# Altium footprint library Connectors THD.PcbLib: 631 footprints (part 10 of 46)
Each footprint in its own frame and in the unit in brackets; x right, y up, seen from the top. Pads: shape width x height; smd on the part's side, far side on the other; paste and mask are expansions set on the pad; w line width, h text height; cw(c..) or ccw(c..) is an arc to the next point about the centre after c.
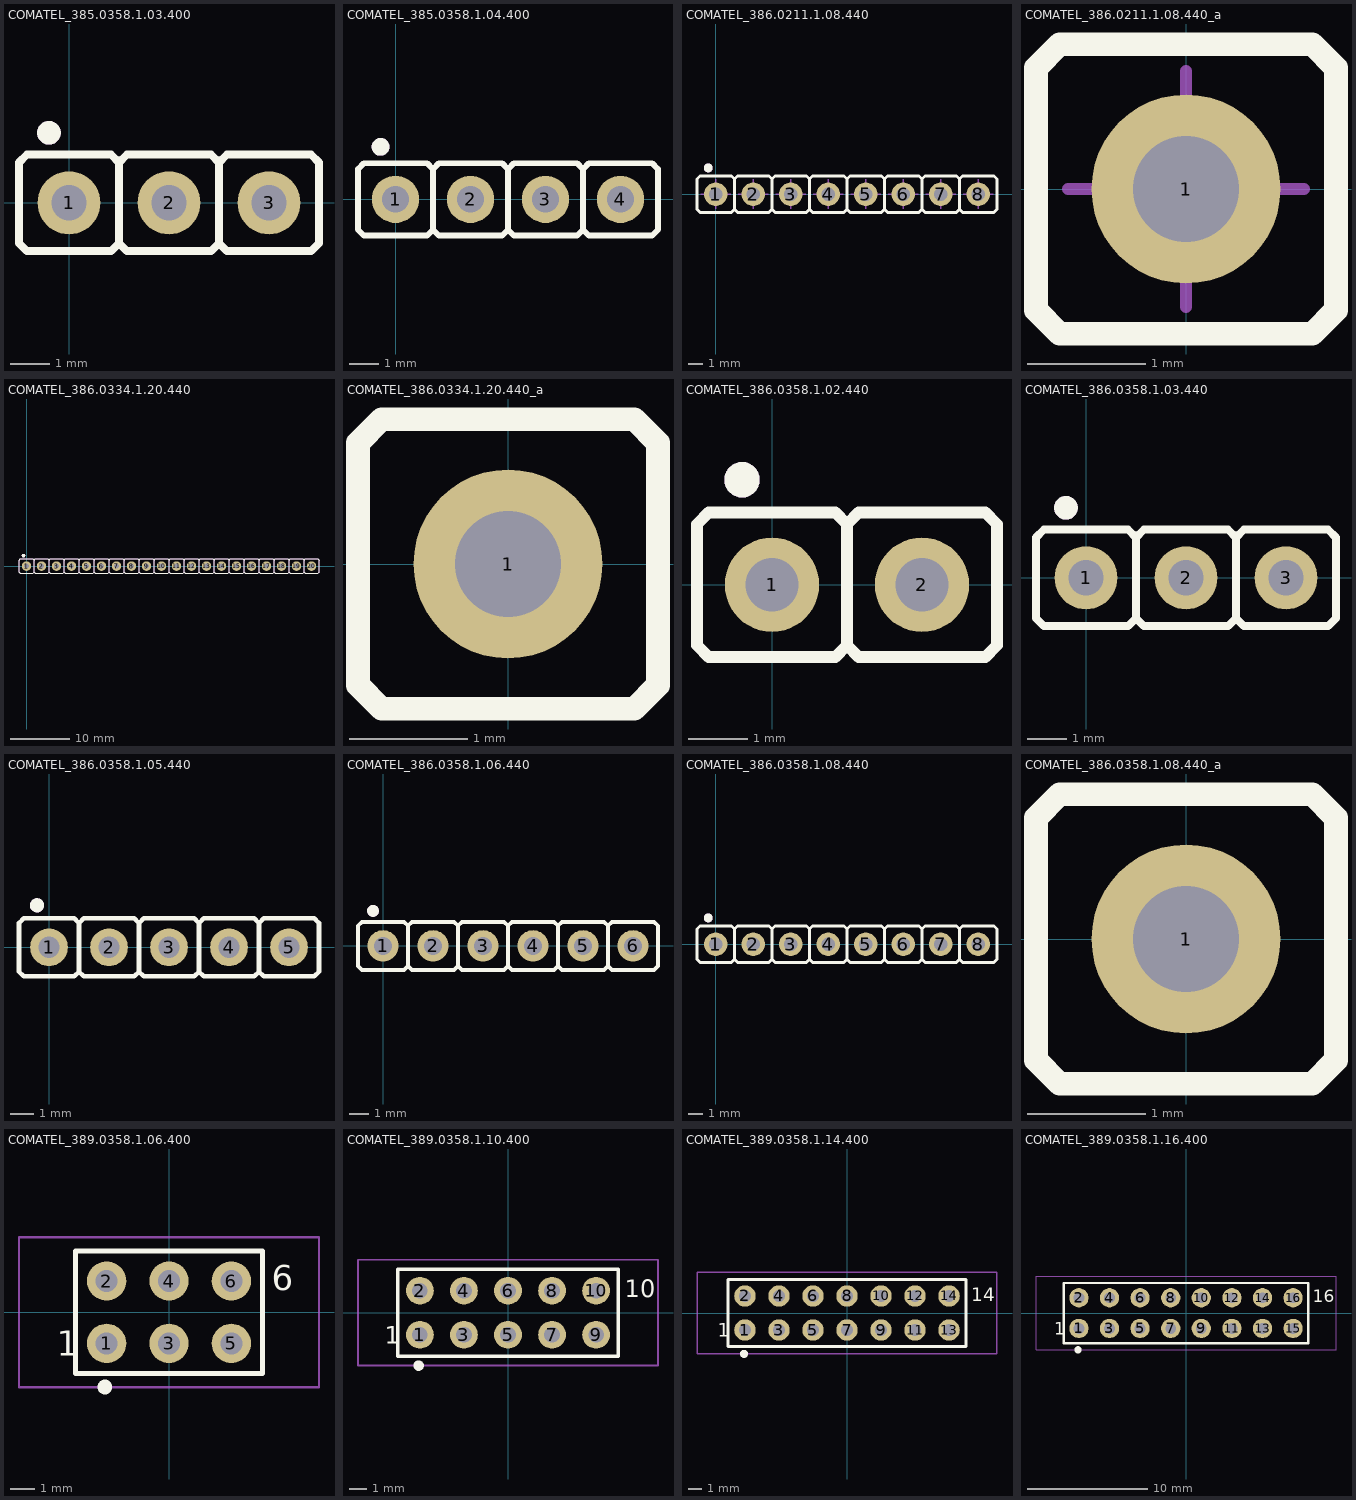
[diagram p9: the footprints below, top view; thin cyan lines are the x and y axes]

## COMATEL_385.0358.1.03.400 [mm] "3 Contacts Straight Strip Header Pitch 2.54mm L=6.3mm ''Mini-Wire-Wrap''"
height 8
pads (3):
  round 1.6 hole 0.9: 1(0,0) 2(2.54,0) 3(5.08,0)
Top Overlay:
  circle w0.3: c-0.508,1.778 r0.15
  lines w0.2: -1.27,1.025 -1.07,1.225 ; -1.27,1.025 -1.27,-1.025 -1.07,-1.225 1.07,-1.225 1.27,-1.025 ; -1.27,1.025 -1.07,1.225 ; -1.07,1.225 1.07,1.225 1.27,1.025 ; 1.27,-1.025 1.27,1.025 ; 1.27,-1.025 1.47,-1.225 3.61,-1.225 3.81,-1.025 ; 1.27,1.025 1.47,1.225 3.61,1.225 3.81,1.025 ; 3.81,-1.025 3.81,1.025 ; 3.81,-1.025 4.01,-1.225 6.15,-1.225 6.35,-1.025 6.35,1.025 6.15,1.225 4.01,1.225 3.81,1.025
Mechanical 14:
  circle w0.3: c-0.508,1.778 r0.15
  lines w0.1: 1.27,-1.025 1.07,-1.225 -1.07,-1.225 -1.27,-1.025 -1.27,1.025 -1.07,1.225 1.07,1.225 1.27,1.025 ; 1.27,-1.025 1.27,1.025 ; 1.27,-1.025 1.47,-1.225 3.61,-1.225 3.81,-1.025 ; 1.27,1.025 1.47,1.225 3.61,1.225 3.81,1.025 ; 3.81,-1.025 3.81,1.025 ; 3.81,-1.025 4.01,-1.225 6.15,-1.225 6.35,-1.025 6.35,1.025 6.15,1.225 4.01,1.225 3.81,1.025
3D body: height 8, standoff -3.2, extent -1.27,-1.225 6.35,1.225

## COMATEL_385.0358.1.04.400 [mm] "4 Contacts Straight Strip Header Pitch 2.54mm L=6.3mm ''Mini-Wire-Wrap''"
height 8
pads (4):
  round 1.6 hole 0.9: 1(0,0) 2(2.54,0) 3(5.08,0) 4(7.62,0)
Top Overlay:
  circle w0.3: c-0.508,1.778 r0.15
  lines w0.2: 1.27,-1.025 1.07,-1.225 -1.07,-1.225 -1.27,-1.025 -1.27,1.025 -1.07,1.225 1.07,1.225 1.27,1.025 ; 1.27,-1.025 1.27,1.025 ; 1.27,-1.025 1.47,-1.225 3.61,-1.225 3.81,-1.025 ; 1.27,1.025 1.47,1.225 3.61,1.225 3.81,1.025 ; 3.81,-1.025 3.81,1.025 ; 3.81,-1.025 4.01,-1.225 6.15,-1.225 6.35,-1.025 ; 3.81,1.025 4.01,1.225 6.15,1.225 6.35,1.025 ; 6.35,-1.025 6.55,-1.225 8.69,-1.225 8.89,-1.025 8.89,1.025 8.69,1.225 6.55,1.225 6.35,1.025 ; 6.35,-1.025 6.35,1.025
Mechanical 14:
  circle w0.3: c-0.508,1.778 r0.15
  lines w0.1: 1.27,-1.025 1.07,-1.225 -1.07,-1.225 -1.27,-1.025 -1.27,1.025 -1.07,1.225 1.07,1.225 1.27,1.025 ; 1.27,-1.025 1.27,1.025 ; 1.27,-1.025 1.47,-1.225 3.61,-1.225 3.81,-1.025 ; 1.27,1.025 1.47,1.225 3.61,1.225 3.81,1.025 ; 3.81,-1.025 3.81,1.025 ; 3.81,-1.025 4.01,-1.225 6.15,-1.225 6.35,-1.025 ; 3.81,1.025 4.01,1.225 6.15,1.225 6.35,1.025 ; 6.35,-1.025 6.55,-1.225 8.69,-1.225 8.89,-1.025 8.89,1.025 8.69,1.225 6.55,1.225 6.35,1.025 ; 6.35,-1.025 6.35,1.025 ; 6.35,-1.025 6.35,1.025
3D body: height 8, standoff -3.2, extent -1.27,-1.225 8.89,1.225

## COMATEL_386.0211.1.08.440 [mm] "Wire-Wrap contact (Pin Length= 16.5mm)"
height 18.2
pads (8):
  round 1.6 hole 0.9: 1(0,0) 2(2.54,0) 3(5.08,0) 4(7.62,0) 5(10.16,0) 6(12.7,0) 7(15.24,0) 8(17.78,0)
Top Overlay:
  circle w0.3: c-0.508,1.778 r0.15
  lines w0.2: 1.27,-1.025 1.27,1.025 ; 1.27,-1.025 1.47,-1.225 3.61,-1.225 3.81,-1.025 ; 1.27,-1.025 1.27,1.025 ; 1.27,-1.025 1.07,-1.225 -1.07,-1.225 -1.27,-1.025 -1.27,1.025 -1.07,1.225 1.07,1.225 1.27,1.025 ; 1.27,1.025 1.47,1.225 3.61,1.225 3.81,1.025 ; 3.81,-1.025 3.81,1.025 ; 3.81,-1.025 4.01,-1.225 6.15,-1.225 6.35,-1.025 ; 3.81,-1.025 3.81,1.025 ; 3.81,1.025 4.01,1.225 6.15,1.225 6.35,1.025 ; 6.35,-1.025 6.35,1.025 ; 6.35,-1.025 6.55,-1.225 8.69,-1.225 8.89,-1.025 ; 6.35,-1.025 6.35,1.025 ; 6.35,1.025 6.55,1.225 8.69,1.225 8.89,1.025 ; 8.89,-1.025 8.89,1.025 ; 8.89,-1.025 9.09,-1.225 11.23,-1.225 11.43,-1.025 ; 8.89,-1.025 8.89,1.025 ; 8.89,1.025 9.09,1.225 11.23,1.225 11.43,1.025 ; 11.43,-1.025 11.43,1.025 ; 11.43,-1.025 11.63,-1.225 13.77,-1.225 13.97,-1.025 ; 11.43,-1.025 11.43,1.025 ; 11.43,1.025 11.63,1.225 13.77,1.225 13.97,1.025 ; 13.97,-1.025 13.97,1.025 ; 13.97,-1.025 14.17,-1.225 16.31,-1.225 16.51,-1.025 ; 13.97,-1.025 13.97,1.025 ; 13.97,1.025 14.17,1.225 16.31,1.225 16.51,1.025 ; 16.51,-1.025 16.51,1.025 ; 16.51,-1.025 16.71,-1.225 18.85,-1.225 19.05,-1.025 19.05,1.025 18.85,1.225 16.71,1.225 16.51,1.025 ; 16.51,-1.025 16.51,1.025
Mechanical 8:
  lines w0.1: -1,0 0,0 ; 0,-1 0,0 ; 0,1 0,0 ; 1,0 0,0 ; 1.54,0 2.54,0 ; 2.54,-1 2.54,0 ; 2.54,1 2.54,0 ; 3.54,0 2.54,0 ; 4.08,0 5.08,0 ; 5.08,-1 5.08,0 ; 5.08,1 5.08,0 ; 6.08,0 5.08,0 ; 6.62,0 7.62,0 ; 7.62,-1 7.62,0 ; 7.62,1 7.62,0 ; 8.62,0 7.62,0 ; 9.16,0 10.16,0 ; 10.16,-1 10.16,0 ; 10.16,1 10.16,0 ; 11.16,0 10.16,0 ; 11.7,0 12.7,0 ; 12.7,-1 12.7,0 ; 12.7,1 12.7,0 ; 13.7,0 12.7,0 ; 14.24,0 15.24,0 ; 15.24,-1 15.24,0 ; 15.24,1 15.24,0 ; 16.24,0 15.24,0 ; 16.78,0 17.78,0 ; 17.78,-1 17.78,0 ; 17.78,1 17.78,0 ; 18.78,0 17.78,0
Mechanical 14:
  circle w0.3: c-0.508,1.778 r0.15
  lines w0.1: 1.27,-1.025 1.47,-1.225 3.61,-1.225 3.81,-1.025 ; 1.27,-1.025 1.27,1.025 ; 1.27,-1.025 1.07,-1.225 -1.07,-1.225 -1.27,-1.025 -1.27,1.025 -1.07,1.225 1.07,1.225 1.27,1.025 ; 1.27,-1.025 1.27,1.025 ; 1.27,1.025 1.47,1.225 3.61,1.225 3.81,1.025 ; 3.81,-1.025 4.01,-1.225 6.15,-1.225 6.35,-1.025 ; 3.81,-1.025 3.81,1.025 ; 3.81,-1.025 3.81,1.025 ; 3.81,1.025 4.01,1.225 6.15,1.225 6.35,1.025 ; 6.35,-1.025 6.55,-1.225 8.69,-1.225 8.89,-1.025 ; 6.35,-1.025 6.35,1.025 ; 6.35,-1.025 6.35,1.025 ; 6.35,1.025 6.55,1.225 8.69,1.225 8.89,1.025 ; 8.89,-1.025 9.09,-1.225 11.23,-1.225 11.43,-1.025 ; 8.89,-1.025 8.89,1.025 ; 8.89,-1.025 8.89,1.025 ; 8.89,1.025 9.09,1.225 11.23,1.225 11.43,1.025 ; 11.43,-1.025 11.63,-1.225 13.77,-1.225 13.97,-1.025 ; 11.43,-1.025 11.43,1.025 ; 11.43,-1.025 11.43,1.025 ; 11.43,1.025 11.63,1.225 13.77,1.225 13.97,1.025 ; 13.97,-1.025 14.17,-1.225 16.31,-1.225 16.51,-1.025 ; 13.97,-1.025 13.97,1.025 ; 13.97,-1.025 13.97,1.025 ; 13.97,1.025 14.17,1.225 16.31,1.225 16.51,1.025 ; 16.51,-1.025 16.71,-1.225 18.85,-1.225 19.05,-1.025 19.05,1.025 18.85,1.225 16.71,1.225 16.51,1.025 ; 16.51,-1.025 16.51,1.025 ; 16.51,-1.025 16.51,1.025
3D body: height 18.2, standoff -3.8, extent -1.27,-1.225 19.05,1.225

## COMATEL_386.0211.1.08.440_a [mm] "Wire-Wrap contact (Pin Length= 16.5mm)"
height 18.2
pads (1):
  round 1.6 hole 0.9: 1(0,0)
Top Overlay:
  lines w0.2: -1.27,-1.025 -1.07,-1.225 1.07,-1.225 1.27,-1.025 1.27,1.025 1.07,1.225 -1.07,1.225 -1.27,1.025 -1.27,-1.025
Mechanical 8:
  lines w0.1: -1,0 0,0 ; 0,-1 0,0 ; 0,1 0,0 ; 1,0 0,0
Mechanical 14:
  lines w0.1: -1.27,-1.025 -1.27,1.025 -1.07,1.225 1.07,1.225 1.27,1.025 1.27,-1.025 1.07,-1.225 -1.07,-1.225 -1.27,-1.025
3D body: height 18.2, standoff -3.8, extent -1.27,-1.225 1.27,1.225

## COMATEL_386.0334.1.20.440 [mm] "Wire-Wrap contact (Pin Length= 7.5mm)"
height 9.2
pads (20):
  round 1.6 hole 0.9: 1(0,0) 2(2.54,0) 3(5.08,0) 4(7.62,0) 5(10.16,0) 6(12.7,0) 7(15.24,0) 8(17.78,0) 9(20.32,0) 10(22.86,0) 11(25.4,0) 12(27.94,0) 13(30.48,0) 14(33.02,0) 15(35.56,0) 16(38.1,0) 17(40.64,0) 18(43.18,0) 19(45.72,0) 20(48.26,0)
Top Overlay:
  drawing of 161 lines, arcs and shapes, not listed
Mechanical 14:
  drawing of 161 lines, arcs and shapes, not listed
3D body: height 9.2, standoff -3.3, extent -1.27,-1.225 49.53,1.225

## COMATEL_386.0334.1.20.440_a [mm] "Wire-Wrap contact (Pin Length= 7.5mm)"
height 9.2
pads (1):
  round 1.6 hole 0.9: 1(0,0)
Top Overlay:
  lines w0.2: -1.27,-1.025 -1.07,-1.225 1.07,-1.225 1.27,-1.025 1.27,1.025 1.07,1.225 -1.07,1.225 -1.27,1.025 -1.27,-1.025
Mechanical 14:
  lines w0.1: -1.27,-1.025 -1.27,1.025 -1.07,1.225 1.07,1.225 1.27,1.025 1.27,-1.025 1.07,-1.225 -1.07,-1.225 -1.27,-1.025
3D body: height 9.2, standoff -3.3, extent -1.27,-1.225 1.27,1.225

## COMATEL_386.0358.1.02.440 [mm] "2 Contacts Straight Strip Header Pitch 2.54mm L=6.3mm ''Mini-Wire-Wrap''"
height 8
pads (2):
  round 1.6 hole 0.9: 1(0,0) 2(2.54,0)
Top Overlay:
  circle w0.3: c-0.508,1.778 r0.15
  lines w0.2: 1.27,-1.025 1.07,-1.225 -1.07,-1.225 -1.27,-1.025 -1.27,1.025 -1.07,1.225 1.07,1.225 1.27,1.025 ; 1.27,-1.025 1.27,1.025 ; 1.27,-1.025 1.47,-1.225 3.61,-1.225 3.81,-1.025 3.81,1.025 3.61,1.225 1.47,1.225 1.27,1.025
Mechanical 14:
  circle w0.3: c-0.508,1.778 r0.15
  lines w0.1: 1.27,-1.025 1.07,-1.225 -1.07,-1.225 -1.27,-1.025 -1.27,1.025 -1.07,1.225 1.07,1.225 1.27,1.025 ; 1.27,-1.025 1.27,1.025 ; 1.27,-1.025 1.47,-1.225 3.61,-1.225 3.81,-1.025 3.81,1.025 3.61,1.225 1.47,1.225 1.27,1.025
3D body: height 8, standoff -3.2, extent -1.27,-1.225 3.81,1.225

## COMATEL_386.0358.1.03.440 [mm] "3 Contacts Straight Strip Header Pitch 2.54mm L=6.3mm ''Mini-Wire-Wrap''"
height 8
pads (3):
  round 1.6 hole 0.9: 1(0,0) 2(2.54,0) 3(5.08,0)
Top Overlay:
  circle w0.3: c-0.508,1.778 r0.15
  lines w0.2: 1.27,-1.025 1.07,-1.225 -1.07,-1.225 -1.27,-1.025 -1.27,1.025 -1.07,1.225 1.07,1.225 1.27,1.025 ; 1.27,-1.025 1.27,1.025 ; 1.27,-1.025 1.47,-1.225 3.61,-1.225 3.81,-1.025 ; 1.27,1.025 1.47,1.225 3.61,1.225 3.81,1.025 ; 3.81,-1.025 3.81,1.025 ; 3.81,-1.025 4.01,-1.225 6.15,-1.225 6.35,-1.025 6.35,1.025 6.15,1.225 4.01,1.225 3.81,1.025
Mechanical 14:
  circle w0.3: c-0.508,1.778 r0.15
  lines w0.1: 1.27,-1.025 1.07,-1.225 -1.07,-1.225 -1.27,-1.025 -1.27,1.025 -1.07,1.225 1.07,1.225 1.27,1.025 ; 1.27,-1.025 1.27,1.025 ; 1.27,-1.025 1.47,-1.225 3.61,-1.225 3.81,-1.025 ; 1.27,1.025 1.47,1.225 3.61,1.225 3.81,1.025 ; 3.81,-1.025 3.81,1.025 ; 3.81,-1.025 4.01,-1.225 6.15,-1.225 6.35,-1.025 6.35,1.025 6.15,1.225 4.01,1.225 3.81,1.025
3D body: height 8, standoff -3.2, extent -1.27,-1.225 6.35,1.225

## COMATEL_386.0358.1.05.440 [mm] "5 Contacts Straight Strip Header Pitch 2.54mm L=6.3mm ''Mini-Wire-Wrap''"
height 8
pads (5):
  round 1.6 hole 0.9: 1(0,0) 2(2.54,0) 3(5.08,0) 4(7.62,0) 5(10.16,0)
Top Overlay:
  circle w0.3: c-0.508,1.778 r0.15
  lines w0.2: 1.27,-1.025 1.07,-1.225 -1.07,-1.225 -1.27,-1.025 -1.27,1.025 -1.07,1.225 1.07,1.225 1.27,1.025 ; 1.27,-1.025 1.27,1.025 ; 1.27,-1.025 1.47,-1.225 3.61,-1.225 3.81,-1.025 ; 1.27,1.025 1.47,1.225 3.61,1.225 3.81,1.025 ; 3.81,-1.025 3.81,1.025 ; 3.81,-1.025 4.01,-1.225 6.15,-1.225 6.35,-1.025 ; 3.81,1.025 4.01,1.225 6.15,1.225 6.35,1.025 ; 6.35,-1.025 6.35,1.025 ; 6.35,-1.025 6.55,-1.225 8.69,-1.225 8.89,-1.025 ; 6.35,1.025 6.55,1.225 8.69,1.225 8.89,1.025 ; 8.89,-1.025 9.09,-1.225 11.23,-1.225 11.43,-1.025 11.43,1.025 11.23,1.225 9.09,1.225 8.89,1.025 ; 8.89,-1.025 8.89,1.025
Mechanical 14:
  circle w0.3: c-0.508,1.778 r0.15
  lines w0.1: 1.27,-1.025 1.07,-1.225 -1.07,-1.225 -1.27,-1.025 -1.27,1.025 -1.07,1.225 1.07,1.225 1.27,1.025 ; 1.27,-1.025 1.27,1.025 ; 1.27,-1.025 1.47,-1.225 3.61,-1.225 3.81,-1.025 ; 1.27,1.025 1.47,1.225 3.61,1.225 3.81,1.025 ; 3.81,-1.025 3.81,1.025 ; 3.81,-1.025 4.01,-1.225 6.15,-1.225 6.35,-1.025 ; 3.81,1.025 4.01,1.225 6.15,1.225 6.35,1.025 ; 6.35,-1.025 6.55,-1.225 8.69,-1.225 8.89,-1.025 ; 6.35,-1.025 6.35,1.025 ; 6.35,1.025 6.55,1.225 8.69,1.225 8.89,1.025 ; 8.89,-1.025 9.09,-1.225 11.23,-1.225 11.43,-1.025 11.43,1.025 11.23,1.225 9.09,1.225 8.89,1.025 ; 8.89,-1.025 8.89,1.025
3D body: height 8, standoff -3.2, extent -1.27,-1.225 11.43,1.225

## COMATEL_386.0358.1.06.440 [mm] "6 Contacts Straight Strip Header Pitch 2.54mm L=6.3mm ''Mini-Wire-Wrap''"
height 8
pads (6):
  round 1.6 hole 0.9: 1(0,0) 2(2.54,0) 3(5.08,0) 4(7.62,0) 5(10.16,0) 6(12.7,0)
Top Overlay:
  circle w0.3: c-0.508,1.778 r0.15
  lines w0.2: 1.27,-1.025 1.07,-1.225 -1.07,-1.225 -1.27,-1.025 -1.27,1.025 -1.07,1.225 1.07,1.225 1.27,1.025 ; 1.27,-1.025 1.27,1.025 ; 1.27,-1.025 1.47,-1.225 3.61,-1.225 3.81,-1.025 ; 1.27,1.025 1.47,1.225 3.61,1.225 3.81,1.025 ; 3.81,-1.025 3.81,1.025 ; 3.81,-1.025 4.01,-1.225 6.15,-1.225 6.35,-1.025 ; 3.81,1.025 4.01,1.225 6.15,1.225 6.35,1.025 ; 6.35,-1.025 6.35,1.025 ; 6.35,-1.025 6.55,-1.225 8.69,-1.225 8.89,-1.025 ; 6.35,1.025 6.55,1.225 8.69,1.225 8.89,1.025 ; 8.89,-1.025 9.09,-1.225 11.23,-1.225 11.43,-1.025 ; 8.89,-1.025 8.89,1.025 ; 8.89,1.025 9.09,1.225 11.23,1.225 11.43,1.025 ; 11.43,-1.025 11.63,-1.225 13.77,-1.225 13.97,-1.025 13.97,1.025 13.77,1.225 11.63,1.225 11.43,1.025 ; 11.43,-1.025 11.43,1.025
Mechanical 14:
  circle w0.3: c-0.508,1.778 r0.15
  lines w0.1: 1.27,-1.025 1.07,-1.225 -1.07,-1.225 -1.27,-1.025 -1.27,1.025 -1.07,1.225 1.07,1.225 1.27,1.025 ; 1.27,-1.025 1.27,1.025 ; 1.27,-1.025 1.47,-1.225 3.61,-1.225 3.81,-1.025 ; 1.27,1.025 1.47,1.225 3.61,1.225 3.81,1.025 ; 3.81,-1.025 3.81,1.025 ; 3.81,-1.025 4.01,-1.225 6.15,-1.225 6.35,-1.025 ; 3.81,1.025 4.01,1.225 6.15,1.225 6.35,1.025 ; 6.35,-1.025 6.55,-1.225 8.69,-1.225 8.89,-1.025 ; 6.35,-1.025 6.35,1.025 ; 6.35,1.025 6.55,1.225 8.69,1.225 8.89,1.025 ; 8.89,-1.025 9.09,-1.225 11.23,-1.225 11.43,-1.025 ; 8.89,-1.025 8.89,1.025 ; 8.89,1.025 9.09,1.225 11.23,1.225 11.43,1.025 ; 11.43,-1.025 11.63,-1.225 13.77,-1.225 13.97,-1.025 13.97,1.025 13.77,1.225 11.63,1.225 11.43,1.025 ; 11.43,-1.025 11.43,1.025
3D body: height 8, standoff -3.2, extent -1.27,-1.225 13.97,1.225

## COMATEL_386.0358.1.08.440 [mm] "8 Contacts Straight Strip Header Pitch 2.54mm L=6.3mm ''Mini-Wire-Wrap''"
height 8
pads (8):
  round 1.6 hole 0.9: 1(0,0) 2(2.54,0) 3(5.08,0) 4(7.62,0) 5(10.16,0) 6(12.7,0) 7(15.24,0) 8(17.78,0)
Top Overlay:
  circle w0.3: c-0.508,1.778 r0.15
  lines w0.2: 1.27,-1.025 1.47,-1.225 3.61,-1.225 3.81,-1.025 ; 1.27,-1.025 1.27,1.025 ; 1.27,-1.025 1.07,-1.225 -1.07,-1.225 -1.27,-1.025 -1.27,1.025 -1.07,1.225 1.07,1.225 1.27,1.025 ; 1.27,1.025 1.47,1.225 3.61,1.225 3.81,1.025 ; 3.81,-1.025 4.01,-1.225 6.15,-1.225 6.35,-1.025 ; 3.81,-1.025 3.81,1.025 ; 3.81,1.025 4.01,1.225 6.15,1.225 6.35,1.025 ; 6.35,-1.025 6.55,-1.225 8.69,-1.225 8.89,-1.025 ; 6.35,-1.025 6.35,1.025 ; 6.35,1.025 6.55,1.225 8.69,1.225 8.89,1.025 ; 8.89,-1.025 9.09,-1.225 11.23,-1.225 11.43,-1.025 ; 8.89,-1.025 8.89,1.025 ; 8.89,1.025 9.09,1.225 11.23,1.225 11.43,1.025 ; 11.43,-1.025 11.63,-1.225 13.77,-1.225 13.97,-1.025 ; 11.43,-1.025 11.43,1.025 ; 11.43,1.025 11.63,1.225 13.77,1.225 13.97,1.025 ; 13.97,-1.025 14.17,-1.225 16.31,-1.225 16.51,-1.025 ; 13.97,-1.025 13.97,1.025 ; 13.97,1.025 14.17,1.225 16.31,1.225 16.51,1.025 ; 16.51,-1.025 16.71,-1.225 18.85,-1.225 19.05,-1.025 19.05,1.025 18.85,1.225 16.71,1.225 16.51,1.025 ; 16.51,-1.025 16.51,1.025
Mechanical 14:
  circle w0.3: c-0.508,1.778 r0.15
  lines w0.1: 1.27,-1.025 1.47,-1.225 3.61,-1.225 3.81,-1.025 ; 1.27,-1.025 1.07,-1.225 -1.07,-1.225 -1.27,-1.025 -1.27,1.025 -1.07,1.225 1.07,1.225 1.27,1.025 ; 1.27,-1.025 1.27,1.025 ; 1.27,1.025 1.47,1.225 3.61,1.225 3.81,1.025 ; 3.81,-1.025 4.01,-1.225 6.15,-1.225 6.35,-1.025 ; 3.81,-1.025 3.81,1.025 ; 3.81,1.025 4.01,1.225 6.15,1.225 6.35,1.025 ; 6.35,-1.025 6.55,-1.225 8.69,-1.225 8.89,-1.025 ; 6.35,-1.025 6.35,1.025 ; 6.35,1.025 6.55,1.225 8.69,1.225 8.89,1.025 ; 8.89,-1.025 9.09,-1.225 11.23,-1.225 11.43,-1.025 ; 8.89,-1.025 8.89,1.025 ; 8.89,1.025 9.09,1.225 11.23,1.225 11.43,1.025 ; 11.43,-1.025 11.63,-1.225 13.77,-1.225 13.97,-1.025 ; 11.43,-1.025 11.43,1.025 ; 11.43,1.025 11.63,1.225 13.77,1.225 13.97,1.025 ; 13.97,-1.025 14.17,-1.225 16.31,-1.225 16.51,-1.025 ; 13.97,-1.025 13.97,1.025 ; 13.97,1.025 14.17,1.225 16.31,1.225 16.51,1.025 ; 16.51,-1.025 16.71,-1.225 18.85,-1.225 19.05,-1.025 19.05,1.025 18.85,1.225 16.71,1.225 16.51,1.025 ; 16.51,-1.025 16.51,1.025
3D body: height 8, standoff -3.2, extent -1.27,-1.225 19.05,1.225

## COMATEL_386.0358.1.08.440_a [mm] "1 Out of 8 Contacts of  Straight Strip Header Pitch 2.54mm L=6.3mm ''Mini-Wire-Wrap''"
height 8
pads (1):
  round 1.6 hole 0.9: 1(0,0)
Top Overlay:
  lines w0.2: -1.27,-1.025 -1.07,-1.225 1.07,-1.225 1.27,-1.025 1.27,1.025 1.07,1.225 -1.07,1.225 -1.27,1.025 -1.27,-1.025
Mechanical 14:
  lines w0.1: -1.27,-1.025 -1.27,1.025 -1.07,1.225 1.07,1.225 1.27,1.025 1.27,-1.025 1.07,-1.225 -1.07,-1.225 -1.27,-1.025
3D body: height 8, standoff -3.2, extent -1.27,-1.225 1.27,1.225

## COMATEL_389.0358.1.06.400 [mm] "6 Contacts - Pitch 2.54mm - Dual Row Straight Strip Header - Insulator 1.7mm"
height 8
pads (6):
  round 1.6 hole 0.9: 1(-2.54,-1.27) 2(-2.54,1.27) 3(0,-1.27) 4(0,1.27) 5(2.54,-1.27) 6(2.54,1.27)
Top Overlay:
  circle w0.3: c-2.613,-3.048 r0.15
  lines w0.2: -3.81,-2.5 -3.81,2.5 3.81,2.5 3.81,-2.5 -3.81,-2.5
  text "1" at -4.572,-1.778 h1.02
  text "6" at 4.191,0.889 h1.02
Mechanical 8:
  lines w0.1: -6.11,-3.05 -6.11,3.05 6.11,3.05 6.11,-3.05 -6.11,-3.05
Mechanical 14:
  lines w0.1: -3.81,-2.5 3.81,-2.5 3.81,2.5 -3.81,2.5 -3.81,-2.5
3D body: height 8, standoff -3.2, extent -3.81,-3 3.81,2.5

## COMATEL_389.0358.1.10.400 [mm] "10 Contacts - Pitch 2.54mm - Dual Row Straight Strip Header - Insulator 1.7mm"
height 8
pads (10):
  round 1.6 hole 0.9: 1(-5.08,-1.27) 2(-5.08,1.27) 3(-2.54,-1.27) 4(-2.54,1.27) 5(0,-1.27) 6(0,1.27) 7(2.54,-1.27) 8(2.54,1.27) 9(5.08,-1.27) 10(5.08,1.27)
Top Overlay:
  circle w0.3: c-5.153,-3.048 r0.15
  lines w0.2: -6.35,-2.5 6.35,-2.5 6.35,2.5 -6.35,2.5 -6.35,-2.5
  text "10" at 6.731,0.889 h1.02
  text "1" at -7.112,-1.778 h1.02
Mechanical 8:
  lines w0.1: -8.65,-3.05 8.65,-3.05 8.65,3.05 -8.65,3.05 -8.65,-3.05
Mechanical 14:
  lines w0.1: -6.35,-2.5 -6.35,2.5 6.35,2.5 6.35,-2.5 -6.35,-2.5
3D body: height 8, standoff -3.2, extent -6.35,-3 6.35,2.5

## COMATEL_389.0358.1.14.400 [mm] "14 Contacts - Pitch 2.54mm - Dual Row Straight Strip Header - Insulator 1.7mm"
height 8
pads (14):
  round 1.6 hole 0.9: 1(-7.62,-1.27) 2(-7.62,1.27) 3(-5.08,-1.27) 4(-5.08,1.27) 5(-2.54,-1.27) 6(-2.54,1.27) 7(0,-1.27) 8(0,1.27) 9(2.54,-1.27) 10(2.54,1.27) 11(5.08,-1.27) 12(5.08,1.27) 13(7.62,-1.27) 14(7.62,1.27)
Top Overlay:
  circle w0.3: c-7.693,-3.048 r0.15
  lines w0.2: -8.89,-2.5 8.89,-2.5 8.89,2.5 -8.89,2.5 -8.89,-2.5
  text "1" at -9.652,-1.778 h1.02
  text "14" at 9.271,0.889 h1.02
Mechanical 8:
  lines w0.1: -11.2,-3.05 11.2,-3.05 11.2,3.05 -11.2,3.05 -11.2,-3.05
Mechanical 14:
  lines w0.1: -8.89,-2.5 -8.89,2.5 8.89,2.5 8.89,-2.5 -8.89,-2.5
3D body: height 8, standoff -3.2, extent -8.89,-3 8.89,2.5

## COMATEL_389.0358.1.16.400 [mm] "16 Contacts - Pitch 2.54mm - Dual Row Straight Strip Header - Insulator 1.7mm"
height 8
pads (16):
  round 1.6 hole 0.9: 1(-8.89,-1.27) 2(-8.89,1.27) 3(-6.35,-1.27) 4(-6.35,1.27) 5(-3.81,-1.27) 6(-3.81,1.27) 7(-1.27,-1.27) 8(-1.27,1.27) 9(1.27,-1.27) 10(1.27,1.27) 11(3.81,-1.27) 12(3.81,1.27) 13(6.35,-1.27) 14(6.35,1.27) 15(8.89,-1.27) 16(8.89,1.27)
Top Overlay:
  circle w0.3: c-8.963,-3.048 r0.15
  lines w0.2: -10.16,-2.5 10.16,-2.5 10.16,2.5 -10.16,2.5 -10.16,-2.5
  text "1" at -10.922,-1.778 h1.02
  text "16" at 10.541,0.889 h1.02
Mechanical 8:
  lines w0.1: -12.45,-3.05 12.45,-3.05 12.45,3.05 -12.45,3.05 -12.45,-3.05
Mechanical 14:
  lines w0.1: -10.16,-2.5 10.16,-2.5 10.16,2.5 -10.16,2.5 -10.16,-2.5
3D body: height 8, standoff -3.2, extent -10.16,-3 10.16,2.5